# Altium footprint library Module.PcbLib: 64 footprints (part 3 of 4)
Each footprint in its own frame and in the unit in brackets; x right, y up, seen from the top. Pads: shape width x height; smd on the part's side, far side on the other; paste and mask are expansions set on the pad; w line width, h text height; cw(c..) or ccw(c..) is an arc to the next point about the centre after c.
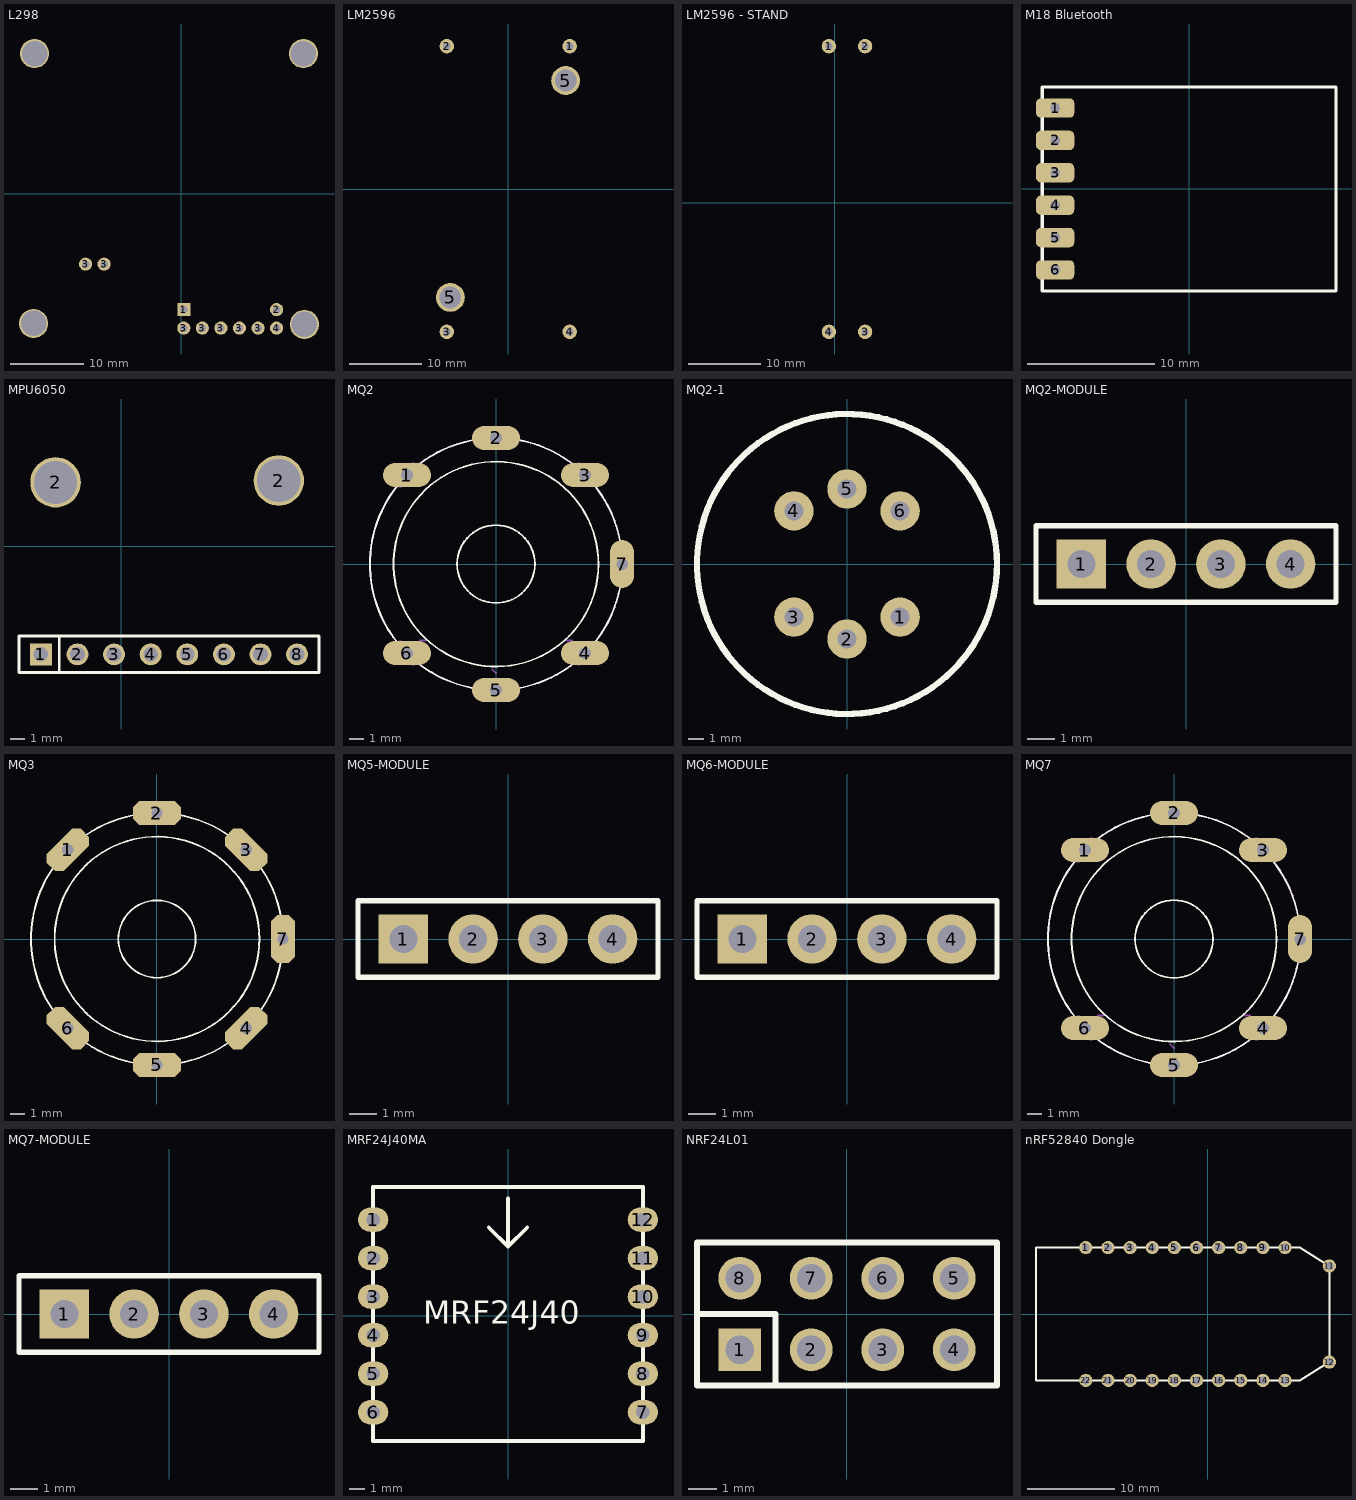
[diagram p2: the footprints below, top view; thin cyan lines are the x and y axes]

## L298 [mm]
height 8.5
pads (18):
  rect 1.8x1.8 hole 1.02: 1(0.381,-15.875)
  round 1.8 hole 1.02: 2(13.081,-15.875) 3(-13.081,-9.652) 3(-10.541,-9.652) 3(0.381,-18.415) 3(2.921,-18.415) 3(5.461,-18.415) 3(8.001,-18.415) 3(10.541,-18.415) 4(13.081,-18.415)
  round 2 hole 3 unplated: ""(-20.193,-17.78) ""(-20.066,19.177) ""(16.764,19.177) ""(16.891,-17.907)
  round 4 hole 3.5: ""(-20.193,-17.78) ""(-20.066,19.177) ""(16.764,19.177) ""(16.891,-17.907)
3D body "User Library-L298N-2.STEP": height 26.51, standoff -3, extent -23.151,-21.209 19.849,22.541

## LM2596 [mm] "DC-DC BUCK MODULE"
pads (6):
  round 2 hole 1: 1(8.509,19.761) 2(-8.491,19.761) 3(-8.491,-19.739) 4(8.509,-19.739)
  round 4 hole 3: 5(-8.001,-14.986) 5(7.95,15.011)
3D body "User Library-DC-DC MODULE LM2596s.STEP": height 12.91, standoff -0.9, extent -10.5,-21.75 10.5,21.75

## LM2596 - STAND [mm] "DC-DC BUCK MODULE"
pads (4):
  round 2 hole 1: 1(-0.816,21.666) 2(4.184,21.666) 3(4.184,-17.834) 4(-0.816,-17.834)
3D body "User Library-DC-DC MODULE LM2596s.STEP": height 23, standoff 2, extent -6.735,-19.845 7.075,23.655

## M18 Bluetooth [mil]
pads (6):
  rrect50% 118.11x60 hole 30: 1(-413.66,250) 2(-413.66,150) 3(-413.66,49.99) 4(-413.66,-50.01) 5(-413.66,-150.01) 6(-413.66,-250.02)
Top Overlay:
  lines w10: -453.55,-314.97 -453.55,314.95 453.54,314.95 453.54,-314.97 -453.55,-314.97
3D body "mh-m18.STEP": height 112.34, standoff 9.03, extent -453.55,-314.97 453.54,314.95

## MPU6050 [mm]
height 8.5
pads (10):
  rect 1.52x1.52 hole 1.02: 1(-5.588,-7.493)
  round 3.5 hole 3: 2(-4.572,4.445) 2(10.922,4.572)
  round 1.52 hole 1.02: 2(-3.048,-7.493) 3(-0.508,-7.493) 4(2.032,-7.493) 5(4.572,-7.493) 6(7.112,-7.493) 7(9.652,-7.493) 8(12.192,-7.493)
Top Overlay:
  lines w0.2: -4.318,-8.763 -4.318,-6.223 ; -7.108,-8.763 13.712,-8.763 13.712,-6.223 -7.108,-6.223 -7.108,-8.763
3D body "61300811821.stp": height 8.51, standoff -3.09, extent -7.108,-8.743 13.712,-6.243
3D body "MPU 6050 IMU.STEP": height 14.54, standoff 3.37, extent -7.366,-8.763 13.741,7.112

## MQ2 [mil] "6P-D17.6X9.8H"
pads (7):
  oval 132x66 hole 32: 1(-244.98,245) 2(0,347) 3(245,245) 4(245,-244.98) 5(0,-346.46) 6(-244.98,-244.98)
  oval 66x132 hole 32: 7(347,0)
Top Overlay:
  circle w5: c0,0 r107
  circle w5: c0,0 r282
  circle w5: c0,0 r347
Mechanical 11:
  lines w5: -210,-210 -195,-210 ; -10,-290 0,-300 ; 195,-210 210,-210
  lines w32: -263.63,-226.24 -227.44,-262.43 ; -263.44,227 -227.25,263 ; -25.59,-346.46 26,-346.46 ; -25.59,347 26,347 ; 227,-263.56 263,-227.37 ; 227,264 263,228 ; 347,-25.59 347,26
Mechanical 16:
  circle w5: c0,0 r347

## MQ2-1 [mm] "6P-D17.6X9.8H"
pads (6):
  round 2.5 hole 1.2: 1(3.359,-3.359) 2(0,-4.75) 3(-3.359,-3.359) 4(-3.359,3.359) 5(0,4.75) 6(3.359,3.359)
Top Overlay:
  circle w0.4: c0,0 r9.5
3D body "MQ Gas Sensor.SLDPRT": height 15, standoff -7, extent -9.824,-9.765 9.77,9.83

## MQ2-MODULE [mm]
height 8.5
pads (4):
  rect 1.8x1.8 hole 1.02: 1(-3.81,0)
  round 1.8 hole 1.02: 2(-1.27,0) 3(1.27,0) 4(3.81,0)
Top Overlay:
  lines w0.2: -5.461,-1.397 5.461,-1.397 5.461,1.397 -5.461,1.397 -5.461,-1.397
3D body "?????? ???? MQ2 (???).STEP": height 38, standoff 2.25, extent -10,-0.289 10,21.461
3D body "61300411821.stp": height 8.51, standoff -3.09, extent -5.33,-1.25 5.33,1.25

## MQ3 [mil]
pads (7):
  oct 132x66 hole 31.5 rot 45: 1(-244.98,244.98) 4(244.98,-244.98)
  oct 132x66 hole 31.5: 2(0,346.46) 5(0,-346.45)
  oct 132x66 hole 31.5 rot 135: 3(244.98,244.98) 6(-244.98,-244.98)
  oct 66x132 hole 31.5: 7(346.46,0)
Top Overlay:
  circle w5: c0,0 r106.3
  circle w5: c0,0 r281.5
  circle w5: c0,0 r346.46
Mechanical 1:
  lines w32: -263.63,-226.24 -227.44,-262.43 ; -263.44,226.65 -227.25,262.84 ; -25.59,-346.45 25.59,-346.45 ; -25.59,346.46 25.59,346.46 ; 226.31,263.94 262.5,227.75 ; 226.63,-263.56 262.82,-227.37 ; 346.46,-25.59 346.46,25.59

## MQ5-MODULE [mm]
height 8.5
pads (4):
  rect 1.8x1.8 hole 1.02: 1(-3.81,0)
  round 1.8 hole 1.02: 2(-1.27,0) 3(1.27,0) 4(3.81,0)
Top Overlay:
  lines w0.2: -5.461,-1.397 -5.461,1.397 5.461,1.397 5.461,-1.397 -5.461,-1.397
3D body "61300411821.stp": height 8.51, standoff -3.09, extent -5.33,-1.25 5.33,1.25
3D body "?????? ???? MQ5 (?????, ?????, ??????).STEP": height 55, standoff 2.75, extent -10,-5.912 10,7.088

## MQ6-MODULE [mm]
height 8.5
pads (4):
  rect 1.8x1.8 hole 1.02: 1(-3.81,0)
  round 1.8 hole 1.02: 2(-1.27,0) 3(1.27,0) 4(3.81,0)
Top Overlay:
  lines w0.2: -5.461,-1.397 -5.461,1.397 5.461,1.397 5.461,-1.397 -5.461,-1.397
3D body "61300411821.stp": height 8.51, standoff -3.09, extent -5.33,-1.25 5.33,1.25
3D body "?????? ???? MQ6 (??????, ?????).STEP": height 38, standoff 2.25, extent -9.873,-0.289 10.127,21.461

## MQ7 [mil] "6P-D17.6X9.8H"
pads (7):
  oval 132x66 hole 32: 1(-244.98,245) 2(0,347) 3(245,245) 4(245,-244.98) 5(0,-346.46) 6(-244.98,-244.98)
  oval 66x132 hole 32: 7(347,0)
Top Overlay:
  circle w5: c0,0 r347
  circle w5: c0,0 r282
  circle w5: c0,0 r107
Mechanical 11:
  lines w5: -210,-210 -195,-210 ; -10,-290 0,-300 ; 195,-210 210,-210
  lines w32: -263.63,-226.24 -227.44,-262.43 ; -263.44,227 -227.25,263 ; -25.59,-346.46 26,-346.46 ; -25.59,347 26,347 ; 227,-263.56 263,-227.37 ; 227,264 263,228 ; 347,-25.59 347,26
Mechanical 16:
  circle w5: c0,0 r347

## MQ7-MODULE [mm]
height 8.5
pads (4):
  rect 1.8x1.8 hole 1.02: 1(-3.81,0)
  round 1.8 hole 1.02: 2(-1.27,0) 3(1.27,0) 4(3.81,0)
Top Overlay:
  lines w0.2: -5.461,-1.397 5.461,-1.397 5.461,1.397 -5.461,1.397 -5.461,-1.397
3D body "?????? ???? MQ7 (CO ??? ??????? ???).STEP": height 42.25, standoff 1.75, extent -11.15,-0.879 11.15,15.621
3D body "61300411821.stp": height 8.51, standoff -3.09, extent -5.33,-1.25 5.33,1.25

## MRF24J40MA [mm] "Microchip Zigbee Module"
pads (12):
  oval 2x1.6 hole 0.9: 1(-8.89,6.35) 2(-8.89,3.81) 3(-8.89,1.27) 4(-8.89,-1.27) 5(-8.89,-3.81) 6(-8.89,-6.35) 7(8.89,-6.35) 8(8.89,-3.81) 9(8.89,-1.27) 10(8.89,1.27) 11(8.89,3.81) 12(8.89,6.35)
Top Overlay:
  lines w0.254: -8.89,1.905 -8.89,-8.255 ; -1.27,5.842 0,4.572 ; 0,7.747 0,4.572 ; 1.27,5.842 0,4.572 ; -8.89,-8.255 8.89,-8.255 8.89,8.509 -8.89,8.509 -8.89,-8.255
  text "MRF24J40" at -5.588,-0.508 h1.52
3D body "61300611121.stp": height 14.07, standoff 2.53, extent 7.62,-7.62 10.16,7.62
3D body "61300611821.stp": height 8.51, standoff -3.09, extent 7.64,-7.87 10.14,7.87
3D body "61300611821.stp": height 8.51, standoff -3.09, extent -10.14,-7.87 -7.64,7.87
3D body "61300611121.stp": height 14.07, standoff 2.53, extent -10.16,-7.62 -7.62,7.62
3D body "User Library-MRF24J40MA2.STEP": height 14.27, standoff 11.18, extent -9.017,-7.874 8.763,20.066

## NRF24L01 [mm]
height 8.5
pads (8):
  rect 1.52x1.52 hole 1.02: 1(-3.81,-1.27)
  round 1.52 hole 1.02: 2(-1.27,-1.27) 3(1.27,-1.27) 4(3.81,-1.27) 5(3.81,1.27) 6(1.27,1.27) 7(-1.27,1.27) 8(-3.81,1.27)
Top Overlay:
  lines w0.2: -5.33,0 -2.54,0 -2.54,-2.54 ; -5.33,-2.54 5.33,-2.54 5.33,2.54 -5.33,2.54 -5.33,-2.54
3D body "61300821821.stp": height 8.51, standoff -3.09, extent -5.33,-2.54 5.33,2.54
3D body "nRF24L01+_enhanced.SLDPRT": height 15.4, standoff 2.55, extent -5.849,-2.794 9.151,26.206

## nRF52840 Dongle [mil]
pads (22):
  round 60 hole 35.43: 1(-550,300) 2(-450,300) 3(-350,300) 4(-250,300) 5(-150,300) 6(-50,300) 7(50,300) 8(150,300) 9(250,300) 10(350,300) 11(550,217) 12(550,-217) 13(350,-300) 14(250,-300) 15(150,-300) 16(50,-300) 17(-50,-300) 18(-150,-300) 19(-250,-300) 20(-350,-300) 21(-450,-300) 22(-550,-300)
Top Overlay:
  lines w10: 550,-217 417,-300 403,-300 350,-300 -550,-300 -775,-300 -775,300 -550,300 350,300 403,300 417,300 550,217 ; 550,-200 550,200
3D body "nrf52840 dongle v4.step": height 348.43, standoff 168.43, extent -775,-300 1037.56,300